# Altium schematic symbol library jlcpcb_2025_04_inductors_extended_0603.schlib: 1269 symbols (part 1 of 7) (continued)
## CLH1608T-R12K-S
designator L?  Inductance: 120nH
Inductor, 120nH, ±10%, 1.3Ω, 300mA, SMD 0603; Manufacturer: Chilisin Elec; Manufacturer Part Number: CLH1608T-R12K-S; Self-Resonant Frequency: 650MHz; Q Factor: 8@50MHz; Package Size: 0603; JLCPCB Basic Part: No; JLCPCB Part Number: C285972; Supplier 1: LCSC; Category: Inductors; Supplier Part Number 1: C285972; Tolerance: ±10%; Rated Current: 300mA; DC Resistance: 1.3Ω; RoHS: Yes; ComponentLink1Description: Datasheet; ComponentLink1URL: https://wmsc.lcsc.com/wmsc/upload/file/pdf/v2/lcsc/2304140030_Chilisin-Elec-CLH1608T-R12K-S_C285972.pdf; ComponentLink2Description: JLCPCB Part URL; ComponentLink2URL: https://jlcpcb.com/partdetail/C285972; ComponentLink3Description: LCSC Part URL; ComponentLink3URL: https://lcsc.com/product-detail/Inductors-SMD_Chilisin-Elec-Chilisin-Elec-CLH1608T-R12K-S_C285972.html
footprint IND-0603 (0603 (1608M) Inductor)
pins: 1, 2

## CLH1608T-R15J-S
designator L?  Inductance: 150nH
Inductor, 150nH, ±5%, 1.7Ω, 250mA, SMD 0603; Manufacturer: Chilisin Elec; Manufacturer Part Number: CLH1608T-R15J-S; Self-Resonant Frequency: 550MHz; Q Factor: 8@50MHz; Package Size: 0603; JLCPCB Basic Part: No; JLCPCB Part Number: C365908; Supplier 1: LCSC; Category: Inductors; Supplier Part Number 1: C365908; Tolerance: ±5%; Rated Current: 250mA; DC Resistance: 1.7Ω; RoHS: Yes; ComponentLink1Description: Datasheet; ComponentLink1URL: https://wmsc.lcsc.com/wmsc/upload/file/pdf/v2/lcsc/2304140030_Chilisin-Elec-CLH1608T-R15J-S_C365908.pdf; ComponentLink2Description: JLCPCB Part URL; ComponentLink2URL: https://jlcpcb.com/partdetail/C365908; ComponentLink3Description: LCSC Part URL; ComponentLink3URL: https://lcsc.com/product-detail/Inductors-SMD_Chilisin-Elec-Chilisin-Elec-CLH1608T-R15J-S_C365908.html
footprint IND-0603 (0603 (1608M) Inductor)
pins: 1, 2

## CLH1608T-R15K-S
designator L?  Inductance: 150nH
Inductor, 150nH, ±10%, 1.7Ω, 250mA, SMD 0603; Manufacturer: Chilisin Elec; Manufacturer Part Number: CLH1608T-R15K-S; Self-Resonant Frequency: 550MHz; Q Factor: 8@50MHz; Package Size: 0603; JLCPCB Basic Part: No; JLCPCB Part Number: C285970; Supplier 1: LCSC; Category: Inductors; Supplier Part Number 1: C285970; Tolerance: ±10%; Rated Current: 250mA; DC Resistance: 1.7Ω; RoHS: Yes; ComponentLink1Description: Datasheet; ComponentLink1URL: https://wmsc.lcsc.com/wmsc/upload/file/pdf/v2/lcsc/1811121621_Chilisin-Elec-CLH1608T-R15K-S_C285970.pdf; ComponentLink2Description: JLCPCB Part URL; ComponentLink2URL: https://jlcpcb.com/partdetail/C285970; ComponentLink3Description: LCSC Part URL; ComponentLink3URL: https://lcsc.com/product-detail/Inductors-SMD_Chilisin-Elec-Chilisin-Elec-CLH1608T-R15K-S_C285970.html
footprint IND-0603 (0603 (1608M) Inductor)
pins: 1, 2

## CLH1608T-R18J-S
designator L?  Inductance: 180nH
Inductor, 180nH, ±5%, 1.9Ω, 250mA, SMD 0603; Manufacturer: Chilisin Elec; Manufacturer Part Number: CLH1608T-R18J-S; Self-Resonant Frequency: 520MHz; Q Factor: 8@50MHz; Package Size: 0603; JLCPCB Basic Part: No; JLCPCB Part Number: C142194; Supplier 1: LCSC; Category: Inductors; Supplier Part Number 1: C142194; Tolerance: ±5%; Rated Current: 250mA; DC Resistance: 1.9Ω; RoHS: Yes; ComponentLink1Description: Datasheet; ComponentLink1URL: https://wmsc.lcsc.com/wmsc/upload/file/pdf/v2/lcsc/2304140030_Chilisin-Elec-CLH1608T-R18J-S_C142194.pdf; ComponentLink2Description: JLCPCB Part URL; ComponentLink2URL: https://jlcpcb.com/partdetail/C142194; ComponentLink3Description: LCSC Part URL; ComponentLink3URL: https://lcsc.com/product-detail/Inductors-SMD_Chilisin-Elec-Chilisin-Elec-CLH1608T-R18J-S_C142194.html
footprint IND-0603 (0603 (1608M) Inductor)
pins: 1, 2

## CLH1608T-R18K-S
designator L?  Inductance: 180nH
Inductor, 180nH, ±10%, 1.9Ω, 250mA, SMD 0603; Manufacturer: Chilisin Elec; Manufacturer Part Number: CLH1608T-R18K-S; Self-Resonant Frequency: 520MHz; Q Factor: 8@50MHz; Package Size: 0603; JLCPCB Basic Part: No; JLCPCB Part Number: C285969; Supplier 1: LCSC; Category: Inductors; Supplier Part Number 1: C285969; Tolerance: ±10%; Rated Current: 250mA; DC Resistance: 1.9Ω; RoHS: Yes; ComponentLink1Description: Datasheet; ComponentLink1URL: https://wmsc.lcsc.com/wmsc/upload/file/pdf/v2/lcsc/2304140030_Chilisin-Elec-CLH1608T-R18K-S_C285969.pdf; ComponentLink2Description: JLCPCB Part URL; ComponentLink2URL: https://jlcpcb.com/partdetail/C285969; ComponentLink3Description: LCSC Part URL; ComponentLink3URL: https://lcsc.com/product-detail/Inductors-SMD_Chilisin-Elec-Chilisin-Elec-CLH1608T-R18K-S_C285969.html
footprint IND-0603 (0603 (1608M) Inductor)
pins: 1, 2

## CMCC1608C1N5SSP
designator L?  Inductance: 1.5nH
Inductor, 1.5nH, 0.1Ω, 500mA, SMD 0603; Manufacturer: Cybermax; Manufacturer Part Number: CMCC1608C1N5SSP; Self-Resonant Frequency: 6GHz; Q Factor: 8@100MHz; Package Size: 0603; JLCPCB Basic Part: No; JLCPCB Part Number: C405052; Supplier 1: LCSC; Category: Inductors; Supplier Part Number 1: C405052; Rated Current: 500mA; DC Resistance: 0.1Ω; RoHS: Yes; ComponentLink1Description: Datasheet; ComponentLink1URL: https://wmsc.lcsc.com/wmsc/upload/file/pdf/v2/lcsc/2304140030_Cybermax-CMCC1608C1N5SSP_C405052.pdf; ComponentLink2Description: JLCPCB Part URL; ComponentLink2URL: https://jlcpcb.com/partdetail/C405052; ComponentLink3Description: LCSC Part URL; ComponentLink3URL: https://lcsc.com/product-detail/Inductors-SMD_Cybermax-Cybermax-CMCC1608C1N5SSP_C405052.html
footprint IND-0603 (0603 (1608M) Inductor)
pins: 1, 2

## CMCC1608C1N8SSP
designator L?  Inductance: 1.8nH
Inductor, 1.8nH, 0.12Ω, 500mA, SMD 0603; Manufacturer: Cybermax; Manufacturer Part Number: CMCC1608C1N8SSP; Self-Resonant Frequency: 6GHz; Q Factor: 8@100MHz; Package Size: 0603; JLCPCB Basic Part: No; JLCPCB Part Number: C405053; Supplier 1: LCSC; Category: Inductors; Supplier Part Number 1: C405053; Rated Current: 500mA; DC Resistance: 0.12Ω; RoHS: Yes; ComponentLink1Description: Datasheet; ComponentLink1URL: https://wmsc.lcsc.com/wmsc/upload/file/pdf/v2/lcsc/2304140030_Cybermax-CMCC1608C1N8SSP_C405053.pdf; ComponentLink2Description: JLCPCB Part URL; ComponentLink2URL: https://jlcpcb.com/partdetail/C405053; ComponentLink3Description: LCSC Part URL; ComponentLink3URL: https://lcsc.com/product-detail/Inductors-SMD_Cybermax-Cybermax-CMCC1608C1N8SSP_C405053.html
footprint IND-0603 (0603 (1608M) Inductor)
pins: 1, 2

## CMCC1608C2N2SSP
designator L?  Inductance: 2.2nH
Inductor, 2.2nH, 0.2Ω, 500mA, SMD 0603; Manufacturer: Cybermax; Manufacturer Part Number: CMCC1608C2N2SSP; Self-Resonant Frequency: 6GHz; Q Factor: 8@100MHz; Package Size: 0603; JLCPCB Basic Part: No; JLCPCB Part Number: C405054; Supplier 1: LCSC; Category: Inductors; Supplier Part Number 1: C405054; Rated Current: 500mA; DC Resistance: 0.2Ω; RoHS: Yes; ComponentLink1Description: Datasheet; ComponentLink1URL: https://wmsc.lcsc.com/wmsc/upload/file/pdf/v2/lcsc/2304140030_Cybermax-CMCC1608C2N2SSP_C405054.pdf; ComponentLink2Description: JLCPCB Part URL; ComponentLink2URL: https://jlcpcb.com/partdetail/C405054; ComponentLink3Description: LCSC Part URL; ComponentLink3URL: https://lcsc.com/product-detail/Inductors-SMD_Cybermax-Cybermax-CMCC1608C2N2SSP_C405054.html
footprint IND-0603 (0603 (1608M) Inductor)
pins: 1, 2

## CMCC1608C3N3SSP
designator L?  Inductance: 3.3nH
Inductor, 3.3nH, 0.2Ω, 500mA, SMD 0603; Manufacturer: Cybermax; Manufacturer Part Number: CMCC1608C3N3SSP; Self-Resonant Frequency: 6GHz; Q Factor: 8@100MHz; Package Size: 0603; JLCPCB Basic Part: No; JLCPCB Part Number: C405056; Supplier 1: LCSC; Category: Inductors; Supplier Part Number 1: C405056; Rated Current: 500mA; DC Resistance: 0.2Ω; RoHS: Yes; ComponentLink1Description: Datasheet; ComponentLink1URL: https://wmsc.lcsc.com/wmsc/upload/file/pdf/v2/lcsc/2304140030_Cybermax-CMCC1608C3N3SSP_C405056.pdf; ComponentLink2Description: JLCPCB Part URL; ComponentLink2URL: https://jlcpcb.com/partdetail/C405056; ComponentLink3Description: LCSC Part URL; ComponentLink3URL: https://lcsc.com/product-detail/Inductors-SMD_Cybermax-Cybermax-CMCC1608C3N3SSP_C405056.html
footprint IND-0603 (0603 (1608M) Inductor)
pins: 1, 2

## CMCC1608C3N9SSP
designator L?  Inductance: 3.9nH
Inductor, 3.9nH, 0.2Ω, 500mA, SMD 0603; Manufacturer: Cybermax; Manufacturer Part Number: CMCC1608C3N9SSP; Self-Resonant Frequency: 6GHz; Q Factor: 8@100MHz; Package Size: 0603; JLCPCB Basic Part: No; JLCPCB Part Number: C405057; Supplier 1: LCSC; Category: Inductors; Supplier Part Number 1: C405057; Rated Current: 500mA; DC Resistance: 0.2Ω; RoHS: Yes; ComponentLink1Description: Datasheet; ComponentLink1URL: https://wmsc.lcsc.com/wmsc/upload/file/pdf/v2/lcsc/2304140030_Cybermax-CMCC1608C3N9SSP_C405057.pdf; ComponentLink2Description: JLCPCB Part URL; ComponentLink2URL: https://jlcpcb.com/partdetail/C405057; ComponentLink3Description: LCSC Part URL; ComponentLink3URL: https://lcsc.com/product-detail/Inductors-SMD_Cybermax-Cybermax-CMCC1608C3N9SSP_C405057.html
footprint IND-0603 (0603 (1608M) Inductor)
pins: 1, 2

## CMCC1608C4N7SSP
designator L?  Inductance: 4.7nH
Inductor, 4.7nH, 0.2Ω, 500mA, SMD 0603; Manufacturer: Cybermax; Manufacturer Part Number: CMCC1608C4N7SSP; Self-Resonant Frequency: 6GHz; Q Factor: 8@100MHz; Package Size: 0603; JLCPCB Basic Part: No; JLCPCB Part Number: C405058; Supplier 1: LCSC; Category: Inductors; Supplier Part Number 1: C405058; Rated Current: 500mA; DC Resistance: 0.2Ω; RoHS: Yes; ComponentLink1Description: Datasheet; ComponentLink1URL: https://wmsc.lcsc.com/wmsc/upload/file/pdf/v2/lcsc/2304140030_Cybermax-CMCC1608C4N7SSP_C405058.pdf; ComponentLink2Description: JLCPCB Part URL; ComponentLink2URL: https://jlcpcb.com/partdetail/C405058; ComponentLink3Description: LCSC Part URL; ComponentLink3URL: https://lcsc.com/product-detail/Inductors-SMD_Cybermax-Cybermax-CMCC1608C4N7SSP_C405058.html
footprint IND-0603 (0603 (1608M) Inductor)
pins: 1, 2

## CMCC1608C5N6SSP
designator L?  Inductance: 5.6nH
Inductor, 5.6nH, 0.3Ω, 500mA, SMD 0603; Manufacturer: Cybermax; Manufacturer Part Number: CMCC1608C5N6SSP; Self-Resonant Frequency: 5GHz; Q Factor: 8@100MHz; Package Size: 0603; JLCPCB Basic Part: No; JLCPCB Part Number: C405059; Supplier 1: LCSC; Category: Inductors; Supplier Part Number 1: C405059; Rated Current: 500mA; DC Resistance: 0.3Ω; RoHS: Yes; ComponentLink1Description: Datasheet; ComponentLink1URL: https://wmsc.lcsc.com/wmsc/upload/file/pdf/v2/lcsc/2304140030_Cybermax-CMCC1608C5N6SSP_C405059.pdf; ComponentLink2Description: JLCPCB Part URL; ComponentLink2URL: https://jlcpcb.com/partdetail/C405059; ComponentLink3Description: LCSC Part URL; ComponentLink3URL: https://lcsc.com/product-detail/Inductors-SMD_Cybermax-Cybermax-CMCC1608C5N6SSP_C405059.html
footprint IND-0603 (0603 (1608M) Inductor)
pins: 1, 2

## CMCC1608C6N2SSP
designator L?  Inductance: 6.2nH
Inductor, 6.2nH, SMD 0603; Manufacturer: Cybermax; Manufacturer Part Number: CMCC1608C6N2SSP; Package Size: 0603; JLCPCB Basic Part: No; JLCPCB Part Number: C405060; Supplier 1: LCSC; Category: Inductors; Supplier Part Number 1: C405060; RoHS: Yes; ComponentLink1Description: Datasheet; ComponentLink1URL: https://wmsc.lcsc.com/wmsc/upload/file/pdf/v2/lcsc/2304140030_Cybermax-CMCC1608C6N2SSP_C405060.pdf; ComponentLink2Description: JLCPCB Part URL; ComponentLink2URL: https://jlcpcb.com/partdetail/C405060; ComponentLink3Description: LCSC Part URL; ComponentLink3URL: https://lcsc.com/product-detail/Inductors-SMD_Cybermax-Cybermax-CMCC1608C6N2SSP_C405060.html
footprint IND-0603 (0603 (1608M) Inductor)
pins: 1, 2

## CMCC1608C6N8JSP
designator L?  Inductance: 6.8nH
Inductor, 6.8nH, ±5%, 0.3Ω, 500mA, SMD 0603; Manufacturer: Cybermax; Manufacturer Part Number: CMCC1608C6N8JSP; Self-Resonant Frequency: 4500MHz; Q Factor: 8@100MHz; Package Size: 0603; JLCPCB Basic Part: No; JLCPCB Part Number: C405061; Supplier 1: LCSC; Category: Inductors; Supplier Part Number 1: C405061; Tolerance: ±5%; Rated Current: 500mA; DC Resistance: 0.3Ω; RoHS: Yes; ComponentLink1Description: Datasheet; ComponentLink1URL: https://wmsc.lcsc.com/wmsc/upload/file/pdf/v2/lcsc/2304140030_Cybermax-CMCC1608C6N8JSP_C405061.pdf; ComponentLink2Description: JLCPCB Part URL; ComponentLink2URL: https://jlcpcb.com/partdetail/C405061; ComponentLink3Description: LCSC Part URL; ComponentLink3URL: https://lcsc.com/product-detail/Inductors-SMD_Cybermax-Cybermax-CMCC1608C6N8JSP_C405061.html
footprint IND-0603 (0603 (1608M) Inductor)
pins: 1, 2

## CMCC1608C8N2JSP
designator L?  Inductance: 8.2nH
Inductor, 8.2nH, ±5%, 0.3Ω, 500mA, SMD 0603; Manufacturer: Cybermax; Manufacturer Part Number: CMCC1608C8N2JSP; Self-Resonant Frequency: 4GHz; Q Factor: 8@100MHz; Package Size: 0603; JLCPCB Basic Part: No; JLCPCB Part Number: C405062; Supplier 1: LCSC; Category: Inductors; Supplier Part Number 1: C405062; Tolerance: ±5%; Rated Current: 500mA; DC Resistance: 0.3Ω; RoHS: Yes; ComponentLink1Description: Datasheet; ComponentLink1URL: https://wmsc.lcsc.com/wmsc/upload/file/pdf/v2/lcsc/2304140030_Cybermax-CMCC1608C8N2JSP_C405062.pdf; ComponentLink2Description: JLCPCB Part URL; ComponentLink2URL: https://jlcpcb.com/partdetail/C405062; ComponentLink3Description: LCSC Part URL; ComponentLink3URL: https://lcsc.com/product-detail/Inductors-SMD_Cybermax-Cybermax-CMCC1608C8N2JSP_C405062.html
footprint IND-0603 (0603 (1608M) Inductor)
pins: 1, 2

## CMCC1608C10NJSP
designator L?  Inductance: 10nH
Inductor, 10nH, ±5%, 0.5Ω, 300mA, SMD 0603; Manufacturer: Cybermax; Manufacturer Part Number: CMCC1608C10NJSP; Self-Resonant Frequency: 3.5GHz; Q Factor: 8@100MHz; Package Size: 0603; JLCPCB Basic Part: No; JLCPCB Part Number: C405063; Supplier 1: LCSC; Category: Inductors; Supplier Part Number 1: C405063; Tolerance: ±5%; Rated Current: 300mA; DC Resistance: 0.5Ω; RoHS: Yes; ComponentLink1Description: Datasheet; ComponentLink1URL: https://wmsc.lcsc.com/wmsc/upload/file/pdf/v2/lcsc/2304140030_Cybermax-CMCC1608C10NJSP_C405063.pdf; ComponentLink2Description: JLCPCB Part URL; ComponentLink2URL: https://jlcpcb.com/partdetail/C405063; ComponentLink3Description: LCSC Part URL; ComponentLink3URL: https://lcsc.com/product-detail/Inductors-SMD_Cybermax-Cybermax-CMCC1608C10NJSP_C405063.html
footprint IND-0603 (0603 (1608M) Inductor)
pins: 1, 2

## CMCC1608C12NJSP
designator L?  Inductance: 12nH
Inductor, 12nH, ±5%, 0.5Ω, 300mA, SMD 0603; Manufacturer: Cybermax; Manufacturer Part Number: CMCC1608C12NJSP; Self-Resonant Frequency: 2800MHz; Q Factor: 8@100MHz; Package Size: 0603; JLCPCB Basic Part: No; JLCPCB Part Number: C405064; Supplier 1: LCSC; Category: Inductors; Supplier Part Number 1: C405064; Tolerance: ±5%; Rated Current: 300mA; DC Resistance: 0.5Ω; RoHS: Yes; ComponentLink1Description: Datasheet; ComponentLink1URL: https://wmsc.lcsc.com/wmsc/upload/file/pdf/v2/lcsc/2304140030_Cybermax-CMCC1608C12NJSP_C405064.pdf; ComponentLink2Description: JLCPCB Part URL; ComponentLink2URL: https://jlcpcb.com/partdetail/C405064; ComponentLink3Description: LCSC Part URL; ComponentLink3URL: https://lcsc.com/product-detail/Inductors-SMD_Cybermax-Cybermax-CMCC1608C12NJSP_C405064.html
footprint IND-0603 (0603 (1608M) Inductor)
pins: 1, 2

## CMCC1608C15NJSP
designator L?  Inductance: 15nH
Inductor, 15nH, ±5%, 0.6Ω, 300mA, SMD 0603; Manufacturer: Cybermax; Manufacturer Part Number: CMCC1608C15NJSP; Self-Resonant Frequency: 2300MHz; Q Factor: 8@100MHz; Package Size: 0603; JLCPCB Basic Part: No; JLCPCB Part Number: C405065; Supplier 1: LCSC; Category: Inductors; Supplier Part Number 1: C405065; Tolerance: ±5%; Rated Current: 300mA; DC Resistance: 0.6Ω; RoHS: Yes; ComponentLink1Description: Datasheet; ComponentLink1URL: https://wmsc.lcsc.com/wmsc/upload/file/pdf/v2/lcsc/2304140030_Cybermax-CMCC1608C15NJSP_C405065.pdf; ComponentLink2Description: JLCPCB Part URL; ComponentLink2URL: https://jlcpcb.com/partdetail/C405065; ComponentLink3Description: LCSC Part URL; ComponentLink3URL: https://lcsc.com/product-detail/Inductors-SMD_Cybermax-Cybermax-CMCC1608C15NJSP_C405065.html
footprint IND-0603 (0603 (1608M) Inductor)
pins: 1, 2

## CMCC1608C18NJSP
designator L?  Inductance: 18nH
Inductor, 18nH, ±5%, 0.6Ω, 300mA, SMD 0603; Manufacturer: Cybermax; Manufacturer Part Number: CMCC1608C18NJSP; Self-Resonant Frequency: 2.2GHz; Q Factor: 8@100MHz; Package Size: 0603; JLCPCB Basic Part: No; JLCPCB Part Number: C405066; Supplier 1: LCSC; Category: Inductors; Supplier Part Number 1: C405066; Tolerance: ±5%; Rated Current: 300mA; DC Resistance: 0.6Ω; RoHS: Yes; ComponentLink1Description: Datasheet; ComponentLink1URL: https://wmsc.lcsc.com/wmsc/upload/file/pdf/v2/lcsc/2304140030_Cybermax-CMCC1608C18NJSP_C405066.pdf; ComponentLink2Description: JLCPCB Part URL; ComponentLink2URL: https://jlcpcb.com/partdetail/C405066; ComponentLink3Description: LCSC Part URL; ComponentLink3URL: https://lcsc.com/product-detail/Inductors-SMD_Cybermax-Cybermax-CMCC1608C18NJSP_C405066.html
footprint IND-0603 (0603 (1608M) Inductor)
pins: 1, 2

## CMCC1608C22NJSP
designator L?  Inductance: 22nH
Inductor, 22nH, ±5%, 0.6Ω, 300mA, SMD 0603; Manufacturer: Cybermax; Manufacturer Part Number: CMCC1608C22NJSP; Self-Resonant Frequency: 2GHz; Q Factor: 8@100MHz; Package Size: 0603; JLCPCB Basic Part: No; JLCPCB Part Number: C405067; Supplier 1: LCSC; Category: Inductors; Supplier Part Number 1: C405067; Tolerance: ±5%; Rated Current: 300mA; DC Resistance: 0.6Ω; RoHS: Yes; ComponentLink1Description: Datasheet; ComponentLink1URL: https://wmsc.lcsc.com/wmsc/upload/file/pdf/v2/lcsc/2304140030_Cybermax-CMCC1608C22NJSP_C405067.pdf; ComponentLink2Description: JLCPCB Part URL; ComponentLink2URL: https://jlcpcb.com/partdetail/C405067; ComponentLink3Description: LCSC Part URL; ComponentLink3URL: https://lcsc.com/product-detail/Inductors-SMD_Cybermax-Cybermax-CMCC1608C22NJSP_C405067.html
footprint IND-0603 (0603 (1608M) Inductor)
pins: 1, 2

## CMCC1608C27NJSP
designator L?  Inductance: 27nH
Inductor, 27nH, ±5%, 0.8Ω, 300mA, SMD 0603; Manufacturer: Cybermax; Manufacturer Part Number: CMCC1608C27NJSP; Self-Resonant Frequency: 1.7GHz; Q Factor: 8@100MHz; Package Size: 0603; JLCPCB Basic Part: No; JLCPCB Part Number: C405068; Supplier 1: LCSC; Category: Inductors; Supplier Part Number 1: C405068; Tolerance: ±5%; Rated Current: 300mA; DC Resistance: 0.8Ω; RoHS: Yes; ComponentLink1Description: Datasheet; ComponentLink1URL: https://wmsc.lcsc.com/wmsc/upload/file/pdf/v2/lcsc/2304140030_Cybermax-CMCC1608C27NJSP_C405068.pdf; ComponentLink2Description: JLCPCB Part URL; ComponentLink2URL: https://jlcpcb.com/partdetail/C405068; ComponentLink3Description: LCSC Part URL; ComponentLink3URL: https://lcsc.com/product-detail/Inductors-SMD_Cybermax-Cybermax-CMCC1608C27NJSP_C405068.html
footprint IND-0603 (0603 (1608M) Inductor)
pins: 1, 2

## CMCC1608C33NJSP
designator L?  Inductance: 33nH
Inductor, 33nH, ±5%, 0.8Ω, 300mA, SMD 0603; Manufacturer: Cybermax; Manufacturer Part Number: CMCC1608C33NJSP; Self-Resonant Frequency: 1.5GHz; Q Factor: 8@100MHz; Package Size: 0603; JLCPCB Basic Part: No; JLCPCB Part Number: C405069; Supplier 1: LCSC; Category: Inductors; Supplier Part Number 1: C405069; Tolerance: ±5%; Rated Current: 300mA; DC Resistance: 0.8Ω; RoHS: Yes; ComponentLink1Description: Datasheet; ComponentLink1URL: https://wmsc.lcsc.com/wmsc/upload/file/pdf/v2/lcsc/2304140030_Cybermax-CMCC1608C33NJSP_C405069.pdf; ComponentLink2Description: JLCPCB Part URL; ComponentLink2URL: https://jlcpcb.com/partdetail/C405069; ComponentLink3Description: LCSC Part URL; ComponentLink3URL: https://lcsc.com/product-detail/Inductors-SMD_Cybermax-Cybermax-CMCC1608C33NJSP_C405069.html
footprint IND-0603 (0603 (1608M) Inductor)
pins: 1, 2

## CMCC1608C39NJSP
designator L?  Inductance: 39nH
Inductor, 39nH, ±5%, 0.8Ω, 300mA, SMD 0603; Manufacturer: Cybermax; Manufacturer Part Number: CMCC1608C39NJSP; Self-Resonant Frequency: 1.3GHz; Q Factor: 8@100MHz; Package Size: 0603; JLCPCB Basic Part: No; JLCPCB Part Number: C405070; Supplier 1: LCSC; Category: Inductors; Supplier Part Number 1: C405070; Tolerance: ±5%; Rated Current: 300mA; DC Resistance: 0.8Ω; RoHS: Yes; ComponentLink1Description: Datasheet; ComponentLink1URL: https://wmsc.lcsc.com/wmsc/upload/file/pdf/v2/lcsc/2304140030_Cybermax-CMCC1608C39NJSP_C405070.pdf; ComponentLink2Description: JLCPCB Part URL; ComponentLink2URL: https://jlcpcb.com/partdetail/C405070; ComponentLink3Description: LCSC Part URL; ComponentLink3URL: https://lcsc.com/product-detail/Inductors-SMD_Cybermax-Cybermax-CMCC1608C39NJSP_C405070.html
footprint IND-0603 (0603 (1608M) Inductor)
pins: 1, 2

## CMCC1608C56NJSP
designator L?  Inductance: 56nH
Inductor, 56nH, ±5%, 1Ω, 300mA, SMD 0603; Manufacturer: Cybermax; Manufacturer Part Number: CMCC1608C56NJSP; Self-Resonant Frequency: 1.1GHz; Q Factor: 8@100MHz; Package Size: 0603; JLCPCB Basic Part: No; JLCPCB Part Number: C405072; Supplier 1: LCSC; Category: Inductors; Supplier Part Number 1: C405072; Tolerance: ±5%; Rated Current: 300mA; DC Resistance: 1Ω; RoHS: Yes; ComponentLink1Description: Datasheet; ComponentLink1URL: https://wmsc.lcsc.com/wmsc/upload/file/pdf/v2/lcsc/2304140030_Cybermax-CMCC1608C56NJSP_C405072.pdf; ComponentLink2Description: JLCPCB Part URL; ComponentLink2URL: https://jlcpcb.com/partdetail/C405072; ComponentLink3Description: LCSC Part URL; ComponentLink3URL: https://lcsc.com/product-detail/Inductors-SMD_Cybermax-Cybermax-CMCC1608C56NJSP_C405072.html
footprint IND-0603 (0603 (1608M) Inductor)
pins: 1, 2

## CMCC1608C68NJSP
designator L?  Inductance: 68nH
Inductor, 68nH, ±5%, 1Ω, 300mA, SMD 0603; Manufacturer: Cybermax; Manufacturer Part Number: CMCC1608C68NJSP; Self-Resonant Frequency: 900MHz; Q Factor: 8@100MHz; Package Size: 0603; JLCPCB Basic Part: No; JLCPCB Part Number: C405073; Supplier 1: LCSC; Category: Inductors; Supplier Part Number 1: C405073; Tolerance: ±5%; Rated Current: 300mA; DC Resistance: 1Ω; RoHS: Yes; ComponentLink1Description: Datasheet; ComponentLink1URL: https://wmsc.lcsc.com/wmsc/upload/file/pdf/v2/lcsc/2304140030_Cybermax-CMCC1608C68NJSP_C405073.pdf; ComponentLink2Description: JLCPCB Part URL; ComponentLink2URL: https://jlcpcb.com/partdetail/C405073; ComponentLink3Description: LCSC Part URL; ComponentLink3URL: https://lcsc.com/product-detail/Inductors-SMD_Cybermax-Cybermax-CMCC1608C68NJSP_C405073.html
footprint IND-0603 (0603 (1608M) Inductor)
pins: 1, 2

## CMCC1608C82NJSP
designator L?  Inductance: 82nH
Inductor, 82nH, ±5%, 1Ω, 300mA, SMD 0603; Manufacturer: Cybermax; Manufacturer Part Number: CMCC1608C82NJSP; Self-Resonant Frequency: 800MHz; Q Factor: 8@100MHz; Package Size: 0603; JLCPCB Basic Part: No; JLCPCB Part Number: C405074; Supplier 1: LCSC; Category: Inductors; Supplier Part Number 1: C405074; Tolerance: ±5%; Rated Current: 300mA; DC Resistance: 1Ω; RoHS: Yes; ComponentLink1Description: Datasheet; ComponentLink1URL: https://wmsc.lcsc.com/wmsc/upload/file/pdf/v2/lcsc/2304140030_Cybermax-CMCC1608C82NJSP_C405074.pdf; ComponentLink2Description: JLCPCB Part URL; ComponentLink2URL: https://jlcpcb.com/partdetail/C405074; ComponentLink3Description: LCSC Part URL; ComponentLink3URL: https://lcsc.com/product-detail/Inductors-SMD_Cybermax-Cybermax-CMCC1608C82NJSP_C405074.html
footprint IND-0603 (0603 (1608M) Inductor)
pins: 1, 2

## CMCC1608CR12JSP
designator L?  Inductance: 120nH
Inductor, 120nH, ±5%, 1.4Ω, 200mA, SMD 0603; Manufacturer: Cybermax; Manufacturer Part Number: CMCC1608CR12JSP; Self-Resonant Frequency: 600MHz; Q Factor: 8@50MHz; Package Size: 0603; JLCPCB Basic Part: No; JLCPCB Part Number: C405076; Supplier 1: LCSC; Category: Inductors; Supplier Part Number 1: C405076; Tolerance: ±5%; Rated Current: 200mA; DC Resistance: 1.4Ω; RoHS: Yes; ComponentLink1Description: Datasheet; ComponentLink1URL: https://wmsc.lcsc.com/wmsc/upload/file/pdf/v2/lcsc/2304140030_Cybermax-CMCC1608CR12JSP_C405076.pdf; ComponentLink2Description: JLCPCB Part URL; ComponentLink2URL: https://jlcpcb.com/partdetail/C405076; ComponentLink3Description: LCSC Part URL; ComponentLink3URL: https://lcsc.com/product-detail/Inductors-SMD_Cybermax-Cybermax-CMCC1608CR12JSP_C405076.html
footprint IND-0603 (0603 (1608M) Inductor)
pins: 1, 2

## CMCC1608CR18JSP
designator L?  Inductance: 180nH
Inductor, 180nH, ±5%, 1.9Ω, 200mA, SMD 0603; Manufacturer: Cybermax; Manufacturer Part Number: CMCC1608CR18JSP; Self-Resonant Frequency: 400MHz; Q Factor: 8@50MHz; Package Size: 0603; JLCPCB Basic Part: No; JLCPCB Part Number: C405078; Supplier 1: LCSC; Category: Inductors; Supplier Part Number 1: C405078; Tolerance: ±5%; Rated Current: 200mA; DC Resistance: 1.9Ω; RoHS: Yes; ComponentLink1Description: Datasheet; ComponentLink1URL: https://wmsc.lcsc.com/wmsc/upload/file/pdf/v2/lcsc/2304140030_Cybermax-CMCC1608CR18JSP_C405078.pdf; ComponentLink2Description: JLCPCB Part URL; ComponentLink2URL: https://jlcpcb.com/partdetail/C405078; ComponentLink3Description: LCSC Part URL; ComponentLink3URL: https://lcsc.com/product-detail/Inductors-SMD_Cybermax-Cybermax-CMCC1608CR18JSP_C405078.html
footprint IND-0603 (0603 (1608M) Inductor)
pins: 1, 2

## CMCC1608CR22JSP
designator L?  Inductance: 220nH
Inductor, 220nH, ±5%, 2.4Ω, 200mA, SMD 0603; Manufacturer: Cybermax; Manufacturer Part Number: CMCC1608CR22JSP; Self-Resonant Frequency: 350MHz; Q Factor: 8@50MHz; Package Size: 0603; JLCPCB Basic Part: No; JLCPCB Part Number: C405079; Supplier 1: LCSC; Category: Inductors; Supplier Part Number 1: C405079; Tolerance: ±5%; Rated Current: 200mA; DC Resistance: 2.4Ω; RoHS: Yes; ComponentLink1Description: Datasheet; ComponentLink1URL: https://wmsc.lcsc.com/wmsc/upload/file/pdf/v2/lcsc/2304140030_Cybermax-CMCC1608CR22JSP_C405079.pdf; ComponentLink2Description: JLCPCB Part URL; ComponentLink2URL: https://jlcpcb.com/partdetail/C405079; ComponentLink3Description: LCSC Part URL; ComponentLink3URL: https://lcsc.com/product-detail/Inductors-SMD_Cybermax-Cybermax-CMCC1608CR22JSP_C405079.html
footprint IND-0603 (0603 (1608M) Inductor)
pins: 1, 2

## CMCC1608CR33JSP
designator L?  Inductance: 330nH
Inductor, 330nH, ±5%, 2.8Ω, 150mA, SMD 0603; Manufacturer: Cybermax; Manufacturer Part Number: CMCC1608CR33JSP; Self-Resonant Frequency: 350MHz; Q Factor: 8@50MHz; Package Size: 0603; JLCPCB Basic Part: No; JLCPCB Part Number: C405081; Supplier 1: LCSC; Category: Inductors; Supplier Part Number 1: C405081; Tolerance: ±5%; Rated Current: 150mA; DC Resistance: 2.8Ω; RoHS: Yes; ComponentLink1Description: Datasheet; ComponentLink1URL: https://wmsc.lcsc.com/wmsc/upload/file/pdf/v2/lcsc/2304140030_Cybermax-CMCC1608CR33JSP_C405081.pdf; ComponentLink2Description: JLCPCB Part URL; ComponentLink2URL: https://jlcpcb.com/partdetail/C405081; ComponentLink3Description: LCSC Part URL; ComponentLink3URL: https://lcsc.com/product-detail/Inductors-SMD_Cybermax-Cybermax-CMCC1608CR33JSP_C405081.html
footprint IND-0603 (0603 (1608M) Inductor)
pins: 1, 2

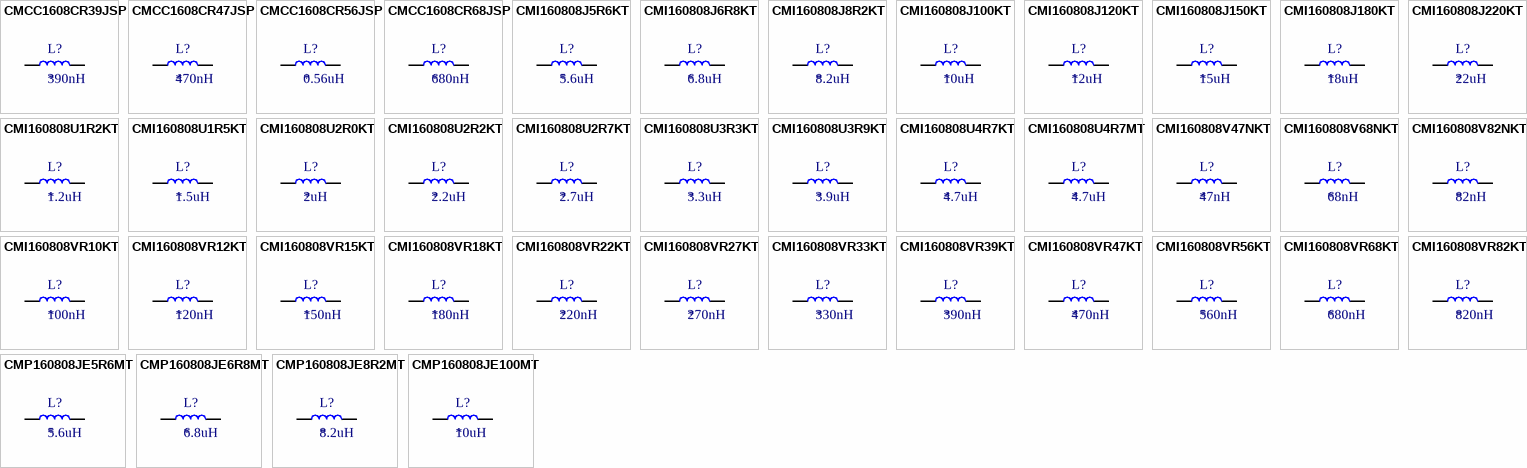
[diagram p3: symbols CMCC1608CR39JSP to CMP160808JE100MT]

## CMCC1608CR39JSP
designator L?  Inductance: 390nH
Inductor, 390nH, ±5%, 3.2Ω, 150mA, SMD 0603; Manufacturer: Cybermax; Manufacturer Part Number: CMCC1608CR39JSP; Self-Resonant Frequency: 300MHz; Q Factor: 8@50MHz; Package Size: 0603; JLCPCB Basic Part: No; JLCPCB Part Number: C405082; Supplier 1: LCSC; Category: Inductors; Supplier Part Number 1: C405082; Tolerance: ±5%; Rated Current: 150mA; DC Resistance: 3.2Ω; RoHS: Yes; ComponentLink1Description: Datasheet; ComponentLink1URL: https://wmsc.lcsc.com/wmsc/upload/file/pdf/v2/lcsc/2304140030_Cybermax-CMCC1608CR39JSP_C405082.pdf; ComponentLink2Description: JLCPCB Part URL; ComponentLink2URL: https://jlcpcb.com/partdetail/C405082; ComponentLink3Description: LCSC Part URL; ComponentLink3URL: https://lcsc.com/product-detail/Inductors-SMD_Cybermax-Cybermax-CMCC1608CR39JSP_C405082.html
footprint IND-0603 (0603 (1608M) Inductor)
pins: 1, 2

## CMCC1608CR47JSP
designator L?  Inductance: 470nH
Inductor, 470nH, ±5%, 3.6Ω, 150mA, SMD 0603; Manufacturer: Cybermax; Manufacturer Part Number: CMCC1608CR47JSP; Self-Resonant Frequency: 250MHz; Q Factor: 8@50MHz; Package Size: 0603; JLCPCB Basic Part: No; JLCPCB Part Number: C405084; Supplier 1: LCSC; Category: Inductors; Supplier Part Number 1: C405084; Tolerance: ±5%; Rated Current: 150mA; DC Resistance: 3.6Ω; RoHS: Yes; ComponentLink1Description: Datasheet; ComponentLink1URL: https://wmsc.lcsc.com/wmsc/upload/file/pdf/v2/lcsc/2304140030_Cybermax-CMCC1608CR47JSP_C405084.pdf; ComponentLink2Description: JLCPCB Part URL; ComponentLink2URL: https://jlcpcb.com/partdetail/C405084; ComponentLink3Description: LCSC Part URL; ComponentLink3URL: https://lcsc.com/product-detail/Inductors-SMD_Cybermax-Cybermax-CMCC1608CR47JSP_C405084.html
footprint IND-0603 (0603 (1608M) Inductor)
pins: 1, 2

## CMCC1608CR56JSP
designator L?  Inductance: 0.56uH
Inductor, 0.56uH, ±5%, 4Ω, 100mA, SMD 0603; Manufacturer: Cybermax; Manufacturer Part Number: CMCC1608CR56JSP; Self-Resonant Frequency: 250MHz; Q Factor: 8@50MHz; Package Size: 0603; JLCPCB Basic Part: No; JLCPCB Part Number: C405085; Supplier 1: LCSC; Category: Inductors; Supplier Part Number 1: C405085; Tolerance: ±5%; Rated Current: 100mA; DC Resistance: 4Ω; RoHS: Yes; ComponentLink1Description: Datasheet; ComponentLink1URL: https://wmsc.lcsc.com/wmsc/upload/file/pdf/v2/lcsc/2304140030_Cybermax-CMCC1608CR56JSP_C405085.pdf; ComponentLink2Description: JLCPCB Part URL; ComponentLink2URL: https://jlcpcb.com/partdetail/C405085; ComponentLink3Description: LCSC Part URL; ComponentLink3URL: https://lcsc.com/product-detail/Inductors-SMD_Cybermax-Cybermax-CMCC1608CR56JSP_C405085.html
footprint IND-0603 (0603 (1608M) Inductor)
pins: 1, 2

## CMCC1608CR68JSP
designator L?  Inductance: 680nH
Inductor, 680nH, ±5%, 4.5Ω, 100mA, SMD 0603; Manufacturer: Cybermax; Manufacturer Part Number: CMCC1608CR68JSP; Self-Resonant Frequency: 250MHz; Q Factor: 8@50MHz; Package Size: 0603; JLCPCB Basic Part: No; JLCPCB Part Number: C405086; Supplier 1: LCSC; Category: Inductors; Supplier Part Number 1: C405086; Tolerance: ±5%; Rated Current: 100mA; DC Resistance: 4.5Ω; RoHS: Yes; ComponentLink1Description: Datasheet; ComponentLink1URL: https://wmsc.lcsc.com/wmsc/upload/file/pdf/v2/lcsc/1912111437_Cybermax-CMCC1608CR68JSP_C405086.pdf; ComponentLink2Description: JLCPCB Part URL; ComponentLink2URL: https://jlcpcb.com/partdetail/C405086; ComponentLink3Description: LCSC Part URL; ComponentLink3URL: https://lcsc.com/product-detail/Inductors-SMD_Cybermax-Cybermax-CMCC1608CR68JSP_C405086.html
footprint IND-0603 (0603 (1608M) Inductor)
pins: 1, 2

## CMI160808J5R6KT
designator L?  Inductance: 5.6uH
Inductor, 5.6uH, ±10%, SMD 0603; Manufacturer: FH(Guangdong Fenghua Advanced Tech); Manufacturer Part Number: CMI160808J5R6KT; Package Size: 0603; JLCPCB Basic Part: No; JLCPCB Part Number: C139205; Supplier 1: LCSC; Category: Inductors; Supplier Part Number 1: C139205; Tolerance: ±10%; RoHS: Yes; ComponentLink1Description: Datasheet; ComponentLink1URL: https://wmsc.lcsc.com/wmsc/upload/file/pdf/v2/lcsc/2302231230_FH--Guangdong-Fenghua-Advanced-Tech-CMI160808J5R6KT_C139205.pdf; ComponentLink2Description: JLCPCB Part URL; ComponentLink2URL: https://jlcpcb.com/partdetail/C139205; ComponentLink3Description: LCSC Part URL; ComponentLink3URL: https://lcsc.com/product-detail/Inductors-SMD_FH-Guangdong-Fenghua-Advanced-Tech-FH-Guangdong-Fenghua-Advanced-Tech-CMI160808J5R6KT_C139205.html
footprint IND-0603 (0603 (1608M) Inductor)
pins: 1, 2

## CMI160808J6R8KT
designator L?  Inductance: 6.8uH
Inductor, 6.8uH, ±10%, 1.55Ω, 5mA, SMD 0603; Manufacturer: FH(Guangdong Fenghua Advanced Tech); Manufacturer Part Number: CMI160808J6R8KT; Package Size: 0603; JLCPCB Basic Part: No; JLCPCB Part Number: C139206; Supplier 1: LCSC; Category: Inductors; Supplier Part Number 1: C139206; Tolerance: ±10%; Rated Current: 5mA; DC Resistance: 1.55Ω; RoHS: Yes; ComponentLink1Description: Datasheet; ComponentLink1URL: https://wmsc.lcsc.com/wmsc/upload/file/pdf/v2/lcsc/2302231230_FH--Guangdong-Fenghua-Advanced-Tech-CMI160808J6R8KT_C139206.pdf; ComponentLink2Description: JLCPCB Part URL; ComponentLink2URL: https://jlcpcb.com/partdetail/C139206; ComponentLink3Description: LCSC Part URL; ComponentLink3URL: https://lcsc.com/product-detail/Inductors-SMD_FH-Guangdong-Fenghua-Advanced-Tech-FH-Guangdong-Fenghua-Advanced-Tech-CMI160808J6R8KT_C139206.html
footprint IND-0603 (0603 (1608M) Inductor)
pins: 1, 2

## CMI160808J8R2KT
designator L?  Inductance: 8.2uH
Inductor, 8.2uH, ±10%, 1.65Ω, 5mA, SMD 0603; Manufacturer: FH(Guangdong Fenghua Advanced Tech); Manufacturer Part Number: CMI160808J8R2KT; Package Size: 0603; JLCPCB Basic Part: No; JLCPCB Part Number: C394964; Supplier 1: LCSC; Category: Inductors; Supplier Part Number 1: C394964; Tolerance: ±10%; Rated Current: 5mA; DC Resistance: 1.65Ω; RoHS: Yes; ComponentLink1Description: Datasheet; ComponentLink1URL: https://wmsc.lcsc.com/wmsc/upload/file/pdf/v2/lcsc/2302231208_FH--Guangdong-Fenghua-Advanced-Tech-CMI160808J8R2KT_C394964.pdf; ComponentLink2Description: JLCPCB Part URL; ComponentLink2URL: https://jlcpcb.com/partdetail/C394964; ComponentLink3Description: LCSC Part URL; ComponentLink3URL: https://lcsc.com/product-detail/Inductors-SMD_FH-Guangdong-Fenghua-Advanced-Tech-FH-Guangdong-Fenghua-Advanced-Tech-CMI160808J8R2KT_C394964.html
footprint IND-0603 (0603 (1608M) Inductor)
pins: 1, 2

## CMI160808J100KT
designator L?  Inductance: 10uH
Inductor, 10uH, ±10%, 1.75Ω, 3mA, SMD 0603; Manufacturer: FH(Guangdong Fenghua Advanced Tech); Manufacturer Part Number: CMI160808J100KT; Package Size: 0603; JLCPCB Basic Part: No; JLCPCB Part Number: C109083; Supplier 1: LCSC; Category: Inductors; Supplier Part Number 1: C109083; Tolerance: ±10%; Rated Current: 3mA; DC Resistance: 1.75Ω; RoHS: Yes; ComponentLink1Description: Datasheet; ComponentLink1URL: https://wmsc.lcsc.com/wmsc/upload/file/pdf/v2/lcsc/2302231030_FH--Guangdong-Fenghua-Advanced-Tech-CMI160808J100KT_C109083.pdf; ComponentLink2Description: JLCPCB Part URL; ComponentLink2URL: https://jlcpcb.com/partdetail/C109083; ComponentLink3Description: LCSC Part URL; ComponentLink3URL: https://lcsc.com/product-detail/Inductors-SMD_FH-Guangdong-Fenghua-Advanced-Tech-FH-Guangdong-Fenghua-Advanced-Tech-CMI160808J100KT_C109083.html
footprint IND-0603 (0603 (1608M) Inductor)
pins: 1, 2

## CMI160808J120KT
designator L?  Inductance: 12uH
Inductor, 12uH, ±10%, 1.85Ω, 3mA, SMD 0603; Manufacturer: FH(Guangdong Fenghua Advanced Tech); Manufacturer Part Number: CMI160808J120KT; Package Size: 0603; JLCPCB Basic Part: No; JLCPCB Part Number: C394962; Supplier 1: LCSC; Category: Inductors; Supplier Part Number 1: C394962; Tolerance: ±10%; Rated Current: 3mA; DC Resistance: 1.85Ω; RoHS: Yes; ComponentLink1Description: Datasheet; ComponentLink1URL: https://wmsc.lcsc.com/wmsc/upload/file/pdf/v2/lcsc/2302231208_FH--Guangdong-Fenghua-Advanced-Tech-CMI160808J120KT_C394962.pdf; ComponentLink2Description: JLCPCB Part URL; ComponentLink2URL: https://jlcpcb.com/partdetail/C394962; ComponentLink3Description: LCSC Part URL; ComponentLink3URL: https://lcsc.com/product-detail/Inductors-SMD_FH-Guangdong-Fenghua-Advanced-Tech-FH-Guangdong-Fenghua-Advanced-Tech-CMI160808J120KT_C394962.html
footprint IND-0603 (0603 (1608M) Inductor)
pins: 1, 2

## CMI160808J150KT
designator L?  Inductance: 15uH
Inductor, 15uH, ±10%, SMD 0603; Manufacturer: FH (Guangdong Fenghua Advanced Tech); Manufacturer Part Number: CMI160808J150KT; Package Size: 0603; JLCPCB Basic Part: No; JLCPCB Part Number: C394963; Supplier 1: LCSC; Category: Inductors; Supplier Part Number 1: C394963; Tolerance: ±10%; RoHS: Yes; ComponentLink1Description: Datasheet; ComponentLink1URL: https://wmsc.lcsc.com/wmsc/upload/file/pdf/v2/lcsc/2302231208_FH--Guangdong-Fenghua-Advanced-Tech-CMI160808J150KT_C394963.pdf; ComponentLink2Description: JLCPCB Part URL; ComponentLink2URL: https://jlcpcb.com/partdetail/C394963; ComponentLink3Description: LCSC Part URL; ComponentLink3URL: https://lcsc.com/product-detail/Inductors-SMD_FH-Guangdong-Fenghua-Advanced-Tech-FH-Guangdong-Fenghua-Advanced-Tech-CMI160808J150KT_C394963.html
footprint IND-0603 (0603 (1608M) Inductor)
pins: 1, 2

## CMI160808J180KT
designator L?  Inductance: 18uH
Inductor, 18uH, ±10%, 2.7Ω, 1mA, SMD 0603; Manufacturer: FH(Guangdong Fenghua Advanced Tech); Manufacturer Part Number: CMI160808J180KT; Package Size: 0603; JLCPCB Basic Part: No; JLCPCB Part Number: C139204; Supplier 1: LCSC; Category: Inductors; Supplier Part Number 1: C139204; Tolerance: ±10%; Rated Current: 1mA; DC Resistance: 2.7Ω; RoHS: Yes; ComponentLink1Description: Datasheet; ComponentLink1URL: https://wmsc.lcsc.com/wmsc/upload/file/pdf/v2/lcsc/2302231230_FH--Guangdong-Fenghua-Advanced-Tech-CMI160808J180KT_C139204.pdf; ComponentLink2Description: JLCPCB Part URL; ComponentLink2URL: https://jlcpcb.com/partdetail/C139204; ComponentLink3Description: LCSC Part URL; ComponentLink3URL: https://lcsc.com/product-detail/Inductors-SMD_FH-Guangdong-Fenghua-Advanced-Tech-FH-Guangdong-Fenghua-Advanced-Tech-CMI160808J180KT_C139204.html
footprint IND-0603 (0603 (1608M) Inductor)
pins: 1, 2

## CMI160808J220KT
designator L?  Inductance: 22uH
Inductor, 22uH, ±10%, SMD 0603; Manufacturer: FH(Guangdong Fenghua Advanced Tech); Manufacturer Part Number: CMI160808J220KT; Package Size: 0603; JLCPCB Basic Part: No; JLCPCB Part Number: C361669; Supplier 1: LCSC; Category: Inductors; Supplier Part Number 1: C361669; Tolerance: ±10%; RoHS: Yes; ComponentLink1Description: Datasheet; ComponentLink1URL: https://wmsc.lcsc.com/wmsc/upload/file/pdf/v2/lcsc/2302231208_FH--Guangdong-Fenghua-Advanced-Tech-CMI160808J220KT_C361669.pdf; ComponentLink2Description: JLCPCB Part URL; ComponentLink2URL: https://jlcpcb.com/partdetail/C361669; ComponentLink3Description: LCSC Part URL; ComponentLink3URL: https://lcsc.com/product-detail/Inductors-SMD_FH-Guangdong-Fenghua-Advanced-Tech-FH-Guangdong-Fenghua-Advanced-Tech-CMI160808J220KT_C361669.html
footprint IND-0603 (0603 (1608M) Inductor)
pins: 1, 2

## CMI160808U1R2KT
designator L?  Inductance: 1.2uH
Inductor, 1.2uH, ±10%, 550mΩ, 25mA, SMD 0603; Manufacturer: FH(Guangdong Fenghua Advanced Tech); Manufacturer Part Number: CMI160808U1R2KT; Package Size: 0603; JLCPCB Basic Part: No; JLCPCB Part Number: C294510; Supplier 1: LCSC; Category: Inductors; Supplier Part Number 1: C294510; Tolerance: ±10%; Rated Current: 25mA; DC Resistance: 550mΩ; RoHS: Yes; ComponentLink1Description: Datasheet; ComponentLink1URL: https://wmsc.lcsc.com/wmsc/upload/file/pdf/v2/lcsc/2302231208_FH--Guangdong-Fenghua-Advanced-Tech-CMI160808U1R2KT_C294510.pdf; ComponentLink2Description: JLCPCB Part URL; ComponentLink2URL: https://jlcpcb.com/partdetail/C294510; ComponentLink3Description: LCSC Part URL; ComponentLink3URL: https://lcsc.com/product-detail/Inductors-SMD_FH-Guangdong-Fenghua-Advanced-Tech-FH-Guangdong-Fenghua-Advanced-Tech-CMI160808U1R2KT_C294510.html
footprint IND-0603 (0603 (1608M) Inductor)
pins: 1, 2

## CMI160808U1R5KT
designator L?  Inductance: 1.5uH
Inductor, 1.5uH, ±10%, 700mΩ, 25mA, SMD 0603; Manufacturer: FH(Guangdong Fenghua Advanced Tech); Manufacturer Part Number: CMI160808U1R5KT; Package Size: 0603; JLCPCB Basic Part: No; JLCPCB Part Number: C139207; Supplier 1: LCSC; Category: Inductors; Supplier Part Number 1: C139207; Tolerance: ±10%; Rated Current: 25mA; DC Resistance: 700mΩ; RoHS: Yes; ComponentLink1Description: Datasheet; ComponentLink1URL: https://wmsc.lcsc.com/wmsc/upload/file/pdf/v2/lcsc/2302231230_FH--Guangdong-Fenghua-Advanced-Tech-CMI160808U1R5KT_C139207.pdf; ComponentLink2Description: JLCPCB Part URL; ComponentLink2URL: https://jlcpcb.com/partdetail/C139207; ComponentLink3Description: LCSC Part URL; ComponentLink3URL: https://lcsc.com/product-detail/Inductors-SMD_FH-Guangdong-Fenghua-Advanced-Tech-FH-Guangdong-Fenghua-Advanced-Tech-CMI160808U1R5KT_C139207.html
footprint IND-0603 (0603 (1608M) Inductor)
pins: 1, 2

## CMI160808U2R0KT
designator L?  Inductance: 2uH
Inductor, 2uH, ±10%, SMD 0603; Manufacturer: FH (Guangdong Fenghua Advanced Tech); Manufacturer Part Number: CMI160808U2R0KT; Package Size: 0603; JLCPCB Basic Part: No; JLCPCB Part Number: C3032627; Supplier 1: LCSC; Category: Inductors; Supplier Part Number 1: C3032627; Tolerance: ±10%; RoHS: Yes; ComponentLink1Description: Datasheet; ComponentLink1URL: https://wmsc.lcsc.com/wmsc/upload/file/pdf/v2/lcsc/2302231130_FH--Guangdong-Fenghua-Advanced-Tech-CMI160808U2R0KT_C3032627.pdf; ComponentLink2Description: JLCPCB Part URL; ComponentLink2URL: https://jlcpcb.com/partdetail/C3032627; ComponentLink3Description: LCSC Part URL; ComponentLink3URL: https://lcsc.com/product-detail/Inductors-SMD_FH-Guangdong-Fenghua-Advanced-Tech-FH-Guangdong-Fenghua-Advanced-Tech-CMI160808U2R0KT_C3032627.html
footprint IND-0603 (0603 (1608M) Inductor)
pins: 1, 2

## CMI160808U2R2KT
designator L?  Inductance: 2.2uH
Inductor, 2.2uH, ±10%, 800mΩ, 25mA, SMD 0603; Manufacturer: FH(Guangdong Fenghua Advanced Tech); Manufacturer Part Number: CMI160808U2R2KT; Package Size: 0603; JLCPCB Basic Part: No; JLCPCB Part Number: C284875; Supplier 1: LCSC; Category: Inductors; Supplier Part Number 1: C284875; Tolerance: ±10%; Rated Current: 25mA; DC Resistance: 800mΩ; RoHS: Yes; ComponentLink1Description: Datasheet; ComponentLink1URL: https://wmsc.lcsc.com/wmsc/upload/file/pdf/v2/lcsc/2302231208_FH--Guangdong-Fenghua-Advanced-Tech-CMI160808U2R2KT_C284875.pdf; ComponentLink2Description: JLCPCB Part URL; ComponentLink2URL: https://jlcpcb.com/partdetail/C284875; ComponentLink3Description: LCSC Part URL; ComponentLink3URL: https://lcsc.com/product-detail/Inductors-SMD_FH-Guangdong-Fenghua-Advanced-Tech-FH-Guangdong-Fenghua-Advanced-Tech-CMI160808U2R2KT_C284875.html
footprint IND-0603 (0603 (1608M) Inductor)
pins: 1, 2

## CMI160808U2R7KT
designator L?  Inductance: 2.7uH
Inductor, 2.7uH, ±10%, 900mΩ, 15mA, SMD 0603; Manufacturer: FH(Guangdong Fenghua Advanced Tech); Manufacturer Part Number: CMI160808U2R7KT; Package Size: 0603; JLCPCB Basic Part: No; JLCPCB Part Number: C139208; Supplier 1: LCSC; Category: Inductors; Supplier Part Number 1: C139208; Tolerance: ±10%; Rated Current: 15mA; DC Resistance: 900mΩ; RoHS: Yes; ComponentLink1Description: Datasheet; ComponentLink1URL: https://wmsc.lcsc.com/wmsc/upload/file/pdf/v2/lcsc/2302231230_FH--Guangdong-Fenghua-Advanced-Tech-CMI160808U2R7KT_C139208.pdf; ComponentLink2Description: JLCPCB Part URL; ComponentLink2URL: https://jlcpcb.com/partdetail/C139208; ComponentLink3Description: LCSC Part URL; ComponentLink3URL: https://lcsc.com/product-detail/Inductors-SMD_FH-Guangdong-Fenghua-Advanced-Tech-FH-Guangdong-Fenghua-Advanced-Tech-CMI160808U2R7KT_C139208.html
footprint IND-0603 (0603 (1608M) Inductor)
pins: 1, 2

## CMI160808U3R3KT
designator L?  Inductance: 3.3uH
Inductor, 3.3uH, ±10%, 1Ω, 15mA, SMD 0603; Manufacturer: FH(Guangdong Fenghua Advanced Tech); Manufacturer Part Number: CMI160808U3R3KT; Package Size: 0603; JLCPCB Basic Part: No; JLCPCB Part Number: C139209; Supplier 1: LCSC; Category: Inductors; Supplier Part Number 1: C139209; Tolerance: ±10%; Rated Current: 15mA; DC Resistance: 1Ω; RoHS: Yes; ComponentLink1Description: Datasheet; ComponentLink1URL: https://wmsc.lcsc.com/wmsc/upload/file/pdf/v2/lcsc/2302231230_FH--Guangdong-Fenghua-Advanced-Tech-CMI160808U3R3KT_C139209.pdf; ComponentLink2Description: JLCPCB Part URL; ComponentLink2URL: https://jlcpcb.com/partdetail/C139209; ComponentLink3Description: LCSC Part URL; ComponentLink3URL: https://lcsc.com/product-detail/Inductors-SMD_FH-Guangdong-Fenghua-Advanced-Tech-FH-Guangdong-Fenghua-Advanced-Tech-CMI160808U3R3KT_C139209.html
footprint IND-0603 (0603 (1608M) Inductor)
pins: 1, 2

## CMI160808U3R9KT
designator L?  Inductance: 3.9uH
Inductor, 3.9uH, ±10%, 1.3Ω, 15mA, SMD 0603; Manufacturer: FH(Guangdong Fenghua Advanced Tech); Manufacturer Part Number: CMI160808U3R9KT; Package Size: 0603; JLCPCB Basic Part: No; JLCPCB Part Number: C139210; Supplier 1: LCSC; Category: Inductors; Supplier Part Number 1: C139210; Tolerance: ±10%; Rated Current: 15mA; DC Resistance: 1.3Ω; RoHS: Yes; ComponentLink1Description: Datasheet; ComponentLink1URL: https://wmsc.lcsc.com/wmsc/upload/file/pdf/v2/lcsc/2302231230_FH--Guangdong-Fenghua-Advanced-Tech-CMI160808U3R9KT_C139210.pdf; ComponentLink2Description: JLCPCB Part URL; ComponentLink2URL: https://jlcpcb.com/partdetail/C139210; ComponentLink3Description: LCSC Part URL; ComponentLink3URL: https://lcsc.com/product-detail/Inductors-SMD_FH-Guangdong-Fenghua-Advanced-Tech-FH-Guangdong-Fenghua-Advanced-Tech-CMI160808U3R9KT_C139210.html
footprint IND-0603 (0603 (1608M) Inductor)
pins: 1, 2

## CMI160808U4R7KT
designator L?  Inductance: 4.7uH
Inductor, 4.7uH, ±10%, SMD 0603; Manufacturer: FH (Guangdong Fenghua Advanced Tech); Manufacturer Part Number: CMI160808U4R7KT; Package Size: 0603; JLCPCB Basic Part: No; JLCPCB Part Number: C711603; Supplier 1: LCSC; Category: Inductors; Supplier Part Number 1: C711603; Tolerance: ±10%; RoHS: Yes; ComponentLink1Description: Datasheet; ComponentLink1URL: https://wmsc.lcsc.com/wmsc/upload/file/pdf/v2/lcsc/2302231130_FH--Guangdong-Fenghua-Advanced-Tech-CMI160808U4R7KT_C711603.pdf; ComponentLink2Description: JLCPCB Part URL; ComponentLink2URL: https://jlcpcb.com/partdetail/C711603; ComponentLink3Description: LCSC Part URL; ComponentLink3URL: https://lcsc.com/product-detail/Inductors-SMD_FH-Guangdong-Fenghua-Advanced-Tech-FH-Guangdong-Fenghua-Advanced-Tech-CMI160808U4R7KT_C711603.html
footprint IND-0603 (0603 (1608M) Inductor)
pins: 1, 2
